# Altium schematic symbol library CUSTOM SCH - Copy.SchLib: 494 symbols (part 1 of 6) (continued)
## 15130802601000 (continued)

## 046277003001883+
designator J?
FFC & FPC Connectors 0.5 FPC 3 pin Kyocera; Manufacturer Part Number: 046277003001883+
footprint 046277003001883
pins: 1, 2, 3, S1 SHIELD, S2 SHIELD

## _FAB
designator FAB?, comment <Name>  PartNumber: 620-00XXX

## A10
designator U?, comment A20
footprint TFBGA441
pins: A1 LCD1_D15/ATAD11/KP_IN5/SMC_VPPPP/EINT15/CSI1_D15/PH15, A2 LCD1_D13/ATAD9/PS2_SDA1/SMC_RST/EINT13/CSI1_D13/PH13, A3 LCD1_D10/ATAD6/KP_IN2/MS_D2/EINT10/CSI1_D10/PH10, A4 LCD1_D6/ATAD2/UART5_TX/MS_BS/EINT6/CSI1_D6/PH6, A5 LCD1_D3/ATAIRQ/UART3_CTS/EINT3/CSI1_D3/PH3, A6 LCD1_D0/ATAA0/UART3_TX/EINT0/CSI1_D0/PH0, A7 UART0_TX/IR1_TX/PB22, A8 TWI1_SCK/PB18, A9 JTAG_DO0/SPI2_MOSI/PB16, A10 JTAG_MS0/SPI2_CS0/PB14, A11 I2S_DO0/AC97_DO/PB8, A12 I2S_BCLK/AC97_BCLK/PB6, A13 IR0_RX/PB4, A14 PWM0/PB2, A15 TWI0_SCK/PB0, A16 SDC3_D2/PI8, A17 SDC3_D0/PI6, A18 SDC3_CMD/PI4, A19 PI2, A20 PI0, A21 TS0_D7/CSI0_D7/PE11, A22 TS0_D5/CSI0_D5/PE9, A23 TS0_D4/CSI0_D4/PE8, AA1 SDQ12/SDQ8, AA2 SDQS1#/SDQS1B, AA3 SA8, AA4 SCS1, AA5 ODT0/SODT, AA6 SRST, AA7 SZQ, AA8 SVREF3, AA9 LCD0_DE/SMC_RST/PD25, AA10 LCD0_D21/SMC_VPPEN/PD21, AA11 LCD0_D19/LVDS1_VN3/PD19, AA12 LCD0_D17/LVDS1_VNC/PD17, AA13 LCD0_D15/LVDS1_VN2/PD15, AA14 LCD0_D13/LVDS1_VN1/PD13, AA15 LCD0_D11/LVDS1_VN0/PD11, AA16 VRP_TVIN/VCC-TVOUT, AA17 TVIN2/VCC25-TVIN, AA18 GND25_TVIN/VRN-TVIN, AA19 HPCOM, AA20 HPCOMFB, AA21 VMIC, AA22 XN_TP/TPX2, AA23 YN_TP/TPY2, AB1 SDQS1, AB2 SDQ8/SDQ11, AB3 SDQ13/SDQ14, AB4 SDQ0/SDQ6, AB5 SDQ5/SDQ3, AB6 SDQS0, AB7 SDQ6/SDQ4, AB8 SDQ3/SDQ5, AB9 LCD0_HSYNC/SMC_SLK/PD26, AB10 LCD0_D22/SMC_VPPPP/PD22, AB11 LCD0_D8/LVDS0_VP3/PD8, AB12 LCD0_D6/LVDS0_VPC/PD6, AB13 LCD0_D4/LVDS0_VP2/PD4, AB14 LCD0_D2/LVDS0_VP1/PD2, AB15 LCD0_D0/LVDS0_VP0/PD0, AB16 TVOUT1/VGA-B/TVIN1, AB17 TVOUT3/TVIN3, AB18 TVIN1/GND, AB19 HPVCCIN/VCCHP, AB20 LINEINL, AB21 LINEINR, AB22 LRADC1, AB23 LRADC0, AC1 SDQ15/SDQ9, AC2 SDQ10/SDQ12, AC3 SDQ7, AC4 SDQ2/SDQ1, AC5 SDQS0#/SDQS0B, AC6 SDQM0, AC7 SDQ1/SDQ0, AC8 SDQ4/SDQ2, AC9 LCD0_VSYNC/SMC_SDA/PD27, AC10 LCD0_D23/SMC_DET/PD23, AC11 LCD0_D9/LVDS0_VN3/PD9, AC12 LCD0_D7/LVDS0_VNC/PD7, AC13 LCD0_D5/LVDS0_VN2/PD5, AC14 LCD0_D3/LVDS0_VN1/PD3, AC15 LCD0_D1/LVDS0_VN0/PD1, AC16 TVOUT0/VGA-G/TVIN0, AC17 TVOUT2/VGA-R/TVIN2, AC18 TVIN0/GND, AC19 HPVCC/HPBP, AC20 MICIN1, AC21 MICIN2, AC22 MIC1OUTP, AC23 MIC1OUTN, B1 LCD1_D16/ATAD12/KP_IN6/SMC_DET/EINT16/CSI1_D16/PH16, B2 LCD1_D14/ATAD10/KP_IN4/SMC_VPPEN/EINT14/CSI1_D14/PH14, B3 LCD1_D11/ATAD7/KP_IN3/MS_D3/EINT11/CSI1_D11/PH11, B4 LCD1_D7/ATAD3/UART5_RX/MS_CLK/EINT7/CSI1_D7/PH7, B5 LCD1_D4/ATAD0/UART4_TX/EINT4/CSI1_D4/PH4, B6 LCD1_D1/ATAA1/UART3_RX/EINT1/CSI1_D1/PH1, B7 UART0_RX/IR1_RX/PB23, B8 TWI1_SDA/PB19, B9 JTAG_DI0/SPI2_MISO/PB17, B10 JTAG_CK0/SPI2_CLK/PB15, B11 SPI2_CS1/SPDIF_DO/PB13, B12 I2S_LRCK/AC97_SYNC/PB7, B13 I2S_MCLK/AC97_MCLK/PB5, B14 IR0_TX/SPDIF_MCLK/STANBYWFI/PB3, B15 TWI0_SDA/PB1, B16 SDC3_D3/PI9, B17 SDC3_D1/PI7, B18 SDC3_CLK/PI5, B19 PWM1/PI3, B20 PI1, B21 TS0_D6/CSI0_D6/PE10, B22 TS0_D3/CSI0_D3/PE7, B23 TS0_D2/CSI0_D2/PE6, C1 LCD1_D17/ATAD13/KP_IN7/SMC_VCCEN/EINT17/CSI1_D17/PH17, C2 LCD1_D18/ATAD14/KP_OUT0/SMC_SLK/EINT18/CSI1_D18/PH18, C3 LCD1_D12/ATAD8/PS2_SCK1/EINT12/CSI1_D12/PH12, C4 LCD1_D8/ATAD4/KP_IN0/MS_D0/EINT8/CSI1_D8/PH8, C5 LCD1_D5/ATAD1/UART4_RX/EINT5/CSI1_D5/PH5, C6 LCD1_D2/ATAA2/UART3_RTS/EINT2/CSI1_D2/PH2, C7 TWI2_SDA/PB21, C8 TWI2_SCK/PB20, C9 I2S_DI/AC97_DI/SPDIF_DI/PB12, C10 I2S_DO3/PB11, C11 I2S_DO2/PB10, C12 I2S_DO1/PB9, C13 ETXERR/CAN_RX/UART1_RING/PA17, C14 RESET#, C15 PS2_SCK1/TCLKIN0/EINT26/SPI0_CS1/PI14, C16 SPI0_MOSI/UART6_TX/EINT24/PI12, C17 SPI0_CS0/UART5_TX/EINT22/PI10, C18 TS1_D7/CSI1_D7/UART4_RX/CSI0_D15/PG11, C19 TS1_D5/CSI1_D5/UART3_CTS/CSI0_D13/PG9, C20 TS1_D3/CSI1_D3/UART3_RX/CSI0_D11/PG7, C21 TS1_D1/CSI1_D1/SDC1_D3/CSI0_D9/PG5, C22 TS0_D1/CSI0_D1/PE5, C23 TS0_D0/CSI0_D0/PE4, D1 LCD1_D19/ATAD15/KP_OUT1/SMC_SDA/EINT19/CSI1_D19/PH19, D2 LCD1_D20/ATAOE/CAN_TX/EINT20/CSI1_D20/PH20, D3 LCD1_D21/ATADREQ/CAN_RX/EINT21/CSI1_D21/PH21, D4 LCD1_D9/ATAD5/KP_IN1/MS_D1/EINT9/CSI1_D9/PH9, D5 ERXD3/SPI1_CS0/PA0, D6 ERXD1/SPI1_MOSI/PA2, D7 ETXD3/SPI1_CS1/PA4, D8 ETXD1/SPI3_CLK/PA6, D9 ERXCK/SPI3_MISO/PA8, D10 ERXDV/UART1_TX/PA10, D11 EMDIO/UART6_TX/UART1_RTS/PA12, D12 ETXCK/UART7_TX/UART1_DTR/PA14, D13 ECOL/CAN_TX/UART1_DCD/PA16, D14 EINT31/SPI1_MISO/UART2_RX/PI19, D15 PS2_SDA1/TCLKIN1/EINT27/SPI1_CS1/PI15, D16 SPI0_MISO/UART6_RX/EINT25/PI13, D17 SPI0_CLK/UART5_RX/EINT23/PI11, D18 TS1_D6/CSI1_D6/UART4_TX/CSI0_D14/PG10, D19 TS1_D4/CSI1_D4/UART3_RTS/CSI0_D12/PG8, D20 TS1_D0/CSI1_D0/SDC1_D2/CSI0_D8/PG4, D21 TS1_DVLD/CSI1_VSYNC/SDC1_D1/PG3, D22 TS0_DVLD/CSI0_VSYNC/PE3, D23 TS0_SYNC/CSI0_HSYNC/PE2, E1 LCD1_D22/ATADACK/KP_OUT2/SDC1_CMD/CSI1_D22/PH22, E2 LCD1_D23/ATACS0/KP_OUT3/SDC1_CLK/CSI1_D23/PH23, E3 LCD1_CLK/ATACS1/KP_OUT4/SDC1_D0/CSI1_PCLK/PH24, E4 LCD1_DE/ATAIORDY/KP_OUT5/SDC1_D1/CSI1_FIELD/PH25, E5 ERXD2/SPI1_CLK/PA1, E6 ERXD0/SPI1_MISO/PA3, E7 ETXD2/SPI3_CS0/PA5, E8 ETXD0/SPI3_MOSI/PA7, E9 ERXERR/SPI3_CS1/PA9, E10 EMDC/UART1_RX/PA11, E11 ETXEN/UART6_RX/UART1_CTS/PA13, E12 ECRS/UART7_RX/UART1_DSR/PA15, E13 HSDA/UART7_RX/PS2_SDA0/PI21, E14 HSCL/UART7_TX/PS2_SCK0/PI20, E15 EINT30/SPI1_MOSI/UART2_TX/PI18, E16 EINT29/SPI1_CLK/UART2_CTS/PI17, E17 EINT28/SPI1_CS0/UART2_RTS/PI16, E18 VCC_CSI1/VCC-PG, E19 TS1_D2/CSI1_D2/UART3_TX/CSI0_D10/PG6, E20 TS1_SYNC/CSI1_HSYNC/SDC1_D0/PG2, E21 TS1_ERR/CSI1_MLCK/SDC1_CLK/PG1, E22 TS0_ERR/CSI0_MCLK/PE1, E23 TS0_CLK/CSI0_PCLK/PE0, F1 CLK32K_IN, F2 CLK32K_OUT, F3 LCD1_HSYNC/ATAIOR/KP_OUT6/SDC1_D2/CSI1_HSYNC/PH26, F4 LCD1_VSYNC/ATAIOW/KP_OUT7/SDC1_D3/CSI1_VSYNC/PH27, F5 NMI#, F19 VCC_CSI0/VCC-PE, F20 TS1_CLK/CSI1_PCLK/SDC1_CMD/PG0, F21 NDQS/PC24, F22 NCE3/PC18, F23 NCE2/PC17, G1 SDQM3, G2 SDQ30/SDQ29, G3 GND/GND_DRAM, G4 GND/GND_DRAM, G5 VCC_DRAM, G19 SPI0_CS0/PC23, G20 NDQ7/PC15, G21 NDQ6/PC14, G22 NDQ3/SDC2_D3/PC11, G23 NDQ2/SDC2_D2/PC10, H1 SDQ25/SDQ26, H2 SDQ27/SDQ31, H3 SVREF0, H4 SVREF1, H5 VCC_DRAM, H8 VCC, H9 VCC, H10 VCC-PA/VCC, H11 VDD_CPU, H12 VDD_CPU, H13 VDD_CPU, H14 VDD_CPU, H15 VCC, H16 TEST, H19 VCC-PC/VCC_NAND, H20 NDQ5/PC13, H21 NDQ4/PC12, H22 NDQ1/SDC2_D1/PC9, H23 NDQ0/SDC2_D0/PC8, J1 SDQ28/SDQ24, J2 SDQS3#/SDQS3B, J3 ODT1/SCK1B, J4 SCKE1, J5 GND/GND_DRAM, J8 VCC, J9 VCC, J10 VCC-PA/VCC, J11 GND, J12 VDD_CPU, J13 VDD_CPU, J14 VCC, J15 VDD-SYS/VDD_INT, J16 VDD-SYS/VDD_INT, J19 VCC-PC/VCC_NAND, J20 NCE7/SPI2_MISO/PC22, J21 NCE6/SPI2_MOSI/PC21, J22 NRB1/SDC2_CLK/PC7, J23 NRB0/SDC2_CMD/PC6, K1 SDQS3/SDQS3, K2 SDQ31/SDQ27, K3 SBA0, K4 SBA2, K5 GND/GND_DRAM, K8 RTC_VDD, K9 VDD-SYS/VDD_INT, K10 VDD-SYS/VDD_INT, K11 GND, K12 GND, K13 GND, K14 ULGND/GND, K15 VDD-SYS/VDD_INT, K16 ULVDD/VDD-USB, K19 SDC0_D2/JTAG_CK1/PF5, K20 SDC0_D3/UART0_RX/PF4, K21 NCE5/SPI2_CLK/PC20, K22 NRE#/PC5, K23 NCE0/PC4, L1 SDQ24/SDQ25, L2 SDQ26/SDQ28, L3 SA10, L4 SBA1, L5 VCC_DRAM, L8 VDD-SYS/VDD_INT, L9 VDD-SYS/VDD_INT, L10 GND, L11 GND, L12 GND, L13 UGND_T/GND, L14 UGND_C/GND, L15 UVCC_T/VCC-USB, L16 UVCC_C/VCC-USB, L19 SDC0_CMD/JTAG_DO1/PF3, L20 SDC0_CLK/UART0_TX/PF2, L21 NCE4/SPI2_CS0/PC19, L22 NCE1/PC3, L23 NCLE/SPI0_CLK/PC2, M1 SDQ29/SQD30, M2 SDQ23, M3 SA7, M4 SA3, M5 VCC_DRAM, M8 VDD_DLL, M9 GND/GND_DLL, M10 GND, M11 GND, M12 GND, M13 GND, M14 GND/GND_SATA, M15 VDD12_SATA, M16 VDD12_SATA, M19 SDC0_D0/JTAG_DI1/PF1, M20 SDC0_D1/JTAG_MS1/PF0, M21 NWP/PC16, M22 NALE/SPI0_MISO/PC1, M23 NWE#/SPI0_MOSI/PC0, N1 SDQ16/SDQ22, N2 SDQ18/SDQ17, N3 SCKE0, N4 SA5, N5 GND/GND_DRAM, N8 ADBG/SADBG, N9 VDD_DLL, N10 GND/GND_DLL, N11 GND, N12 GND, N13 GND/GND_SATA, N14 GND/GND_SATA, N15 VDD25_SATA, N16 VDD25_SATA, N19 VCC_CARD/VCC-PF, N20 DM0, N21 DP0, N22 CLK24M_OUT, N23 CLK24M_IN, P1 SDQ21/SDQ19, P2 SDQS2#/SDQS2B, P3 SA12, P4 SA9, P5 GND/GND_DRAM, P8 SDBG0/SDDBG0, P9 VDD_DLL, P10 GND/GND_DLL, P11 GND, P12 GND, P13 GND/GND_HDMI, P14 GND/GND_HDMI, P15 PLLGND/GND, P16 PLLVP25/VCC-PLL, P19 CLKM_SATA, P20 DM1, P21 DP1, P22 HPD_HDMI/HHPD, P23 CEC_HDMI/HCEC, R1 SDQS2, R2 SDQM2, R3 SA14, R4 SA1, R5 VCC_DRAM, R8 SDBG1/SADBG1, R9 VDD-SYS/VDD_INT, R10 VDD-SYS/VDD_INT, R11 GND, R12 GND, R13 GND/GND_HDMI, R14 VREGIO2_HDMI/NC, R15 PLLVREG, R16 PLLREGIO/NC, R19 CLKP_SATA, R20 DM2, R21 DP2, R22 SDA_HDMI/HSDA, R23 SCL_HDMI/HSCL, T1 SDQ22/SDQ20, T2 SDQ17/SDQ16, T3 SWE, T4 SRAS, T5 VCC_DRAM, T8 VDD-SYS/VDD_INT, T9 EFUSE_VDDQ/VDDQE, T10 JTAG_SEL, T11 GND, T12 GND, T13 VP_HDMI/VCC-HDMI, T14 VREGIO1_HDMI/HVREG1, T15 PLLTEST, T16 PLLDV, T19 AVCC, T20 TXP_SATA, T21 TXM_SATA, T22 TX2N_HDMI/HTX2N, T23 TX2P_HDMI/HTX2P, U1 SDQ19/SDQ21, U2 SDQ20/SDQ18, U3 SCAS, U4 SA2, U5 GND/GND_DRAM, U19 AGND, U20 RXM_SATA, U21 RXP_SATA, U22 TX1N_HDMI/HTX1N, U23 TX1P_HDMI/HTX1P, V1 SCK, V2 SCK#/SCKB, V3 SCS0/SCS, V4 SA6, V5 GND/GND_DRAM, V19 HPGND, V20 VRA2, V21 REXT_SATA, V22 TX0N_HDMI/HTX0N, V23 TX0P_HDMI/HTX0P, W1 SDQM1, W2 SDQ14/SDQ13, W3 SA11, W4 SA0, W5 VCC_DRAM, W6 VCC_DRAM, W7 VCC_DRAM, W8 UBOOT_SEL, W9 GND/GND_LVDS, W10 GND/GND_LVDS, W11 GND/GND_LVDS, W12 VCC_LVDS, W13 VCC_LVDS, W14 VCC_LVDS, W15 VCC33_TVOUT/TVOUT0, W16 VCC33_TVIN/TVOUT2, W17 VDD25_TVIN/VRP-TVIN, W18 GND33_TVOUT/TVOUT1, W19 HPOUTR/HPR, W20 VRA1, W21 VRP, W22 TXCN_HDMI/HTXCN, W23 TXCP_HDMI/HTXCP, Y1 SDQ9/SDQ10, Y2 SDQ11/SDQ15, Y3 SA13, Y4 SA4, Y5 SVREF2, Y6 VCC_DRAM, Y7 GND/GND_DRAM, Y8 GND/GND_DRAM, Y9 LCD0_CLK/SMC_VCCEN/PD24, Y10 LCD0_D20/CSI1_MCLK/PD20, Y11 LCD0_D18/LVDS1_VP3/PD18, Y12 LCD0_D16/LVDS1_VPC/PD16, Y13 LCD0_D14/LVDS1_VP2/PD14, Y14 LCD0_D12/LVDS1_VP1/PD12, Y15 LCD0_D10/LVDS1_VP0/PD10, Y16 VRN_TVIN/VCC-TVIN, Y17 TVIN3/GND, Y18 GND33_TVIN/TVOUT3, Y19 HPOUTL/HPL, Y20 FMINL, Y21 FMINR, Y22 XP_TP/TPX1, Y23 YP_TP/TPY1
text: ERXD3/; ERXD2/; ERXD1/; ERXD0/; ETXD3/; ETXD2/; ETXD1/; ETXD0/; ERXCK/; ERXERR/; ERXDV/; EMDC/; EMDIO/; /TWI3_SCK; ETEN/; /TWI3_SDA; ETXCK/; /TWI4_SCK; ECRS/; ECOL/; ETXERR/; /OWA-MCLK; /CLK_OUT_A; /CLK_OUT_B

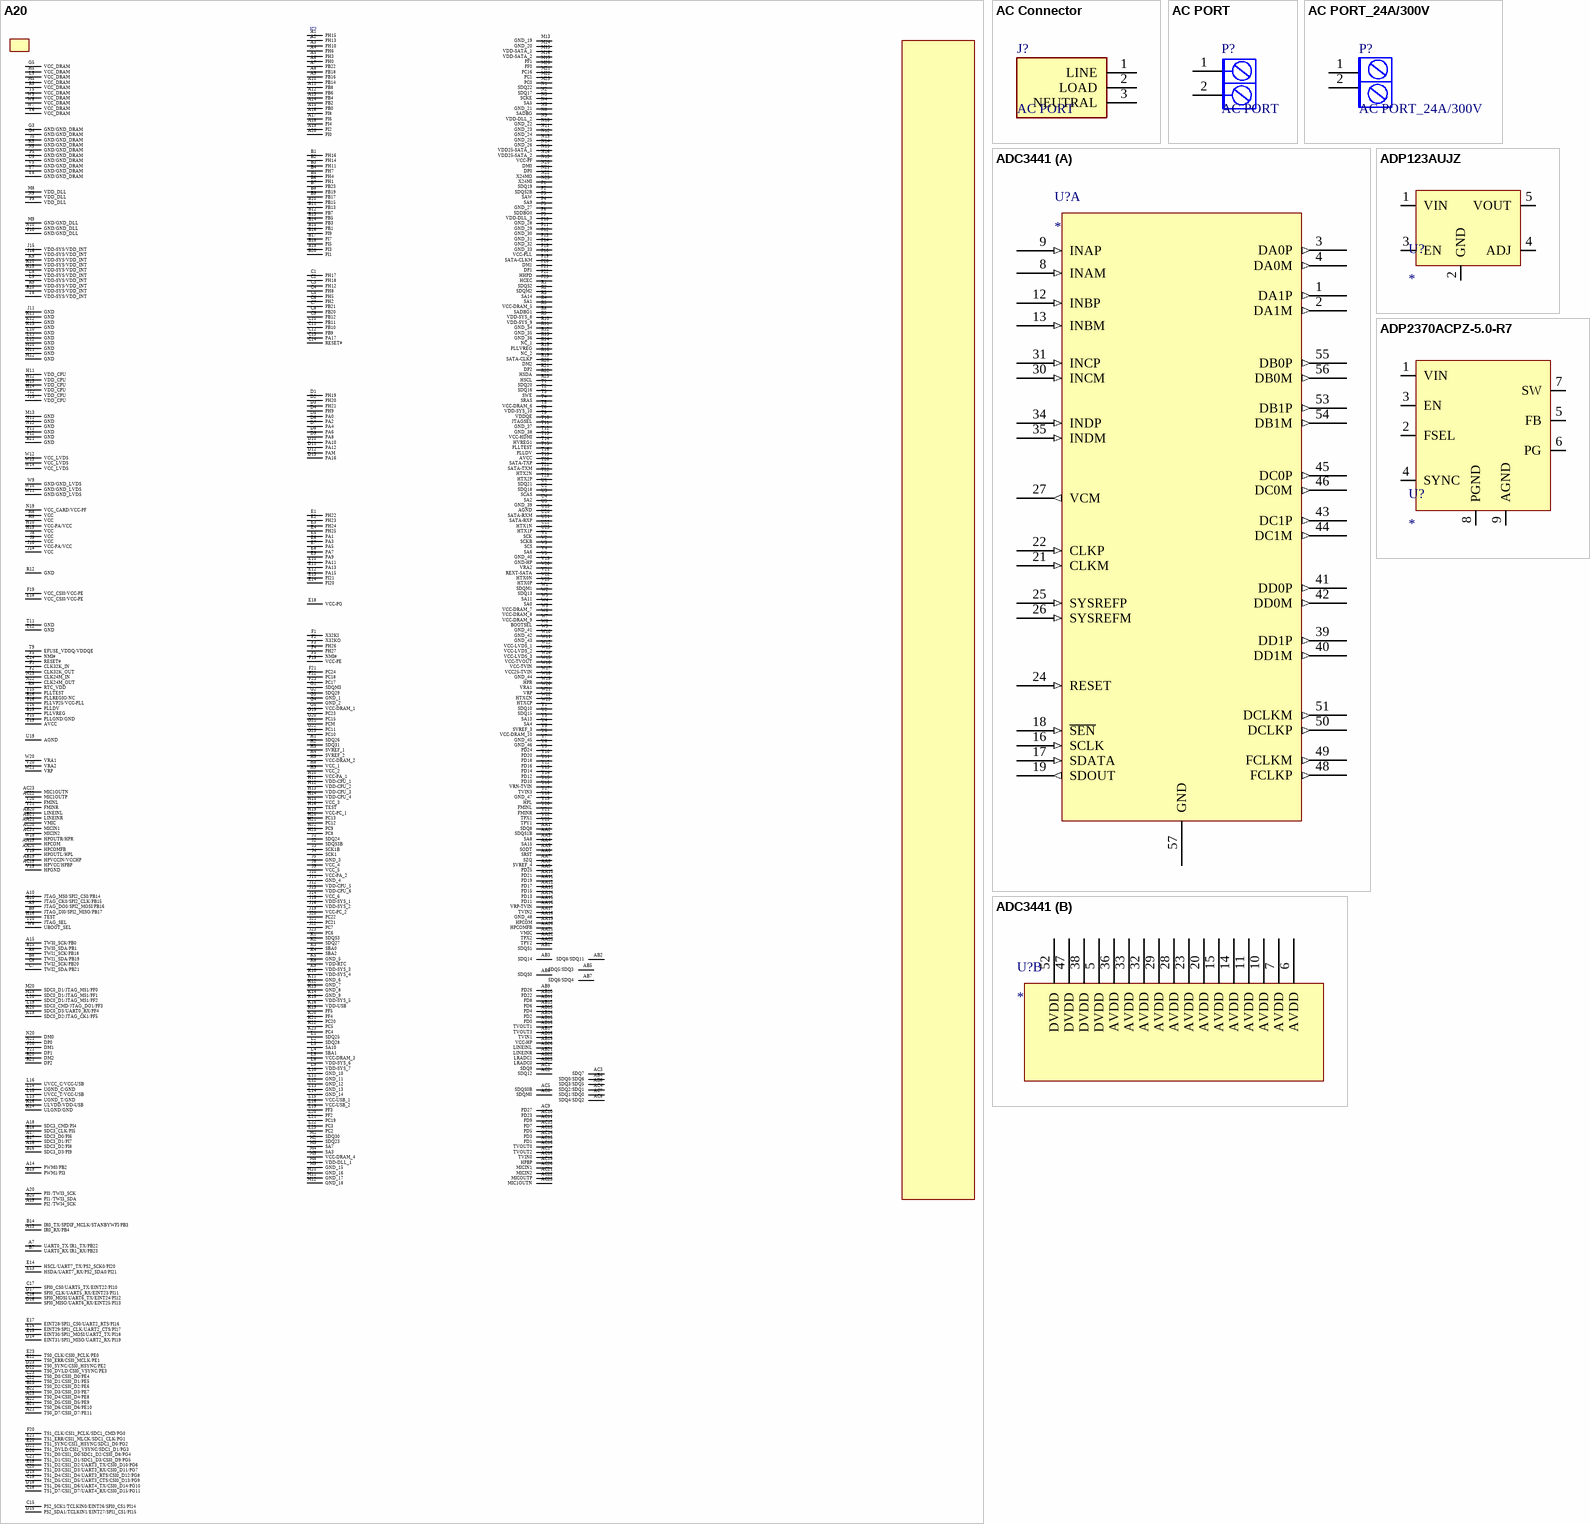
[diagram p2: symbols A20 to ADP2370ACPZ-5.0-R7]

## A20
designator IC?
Integrated Circuit; Manufacturer_Name: Allwinner Technology; Manufacturer_Part_Number: A20; Datasheet Link: http://dl.linux-sunxi.org/A20/A20%20Brief%202013-02-27.pdf; Height: 1.4mm; Arrow Part Number: A20
footprint FBGA441
pins: A1 PH15, A2 PH13, A3 PH10, A4 PH6, A5 PH3, A6 PH0, A7 PB22, A7 UART0_TX/IR1_TX/PB22, A8 PB18, A8 TWI1_SCK/PB18, A9 PB16, A9 JTAG_DO0/SPI2_MOSI/PB16, A10 PB14, A10 JTAG_MS0/SPI2_CS0/PB14, A11 PB8, A12 PB6, A13 PB4, A13 IR0_RX/PB4, A14 PB2, A14 PWM0/PB2, A15 PB0, A15 TWI0_SCK/PB0, A16 PI8, A16 SDC3_D2/PI8, A17 PI6, A17 SDC3_D0/PI6, A18 PI4, A18 SDC3_CMD/PI4, A19 PI2, A19 PI2 /TWI4_SCK, A20 PI0, A20 PI0 /TWI3_SCK, A21 TS0_D7/CSI0_D7/PE11, A22 TS0_D5/CSI0_D5/PE9, A23 TS0_D4/CSI0_D4/PE8, AA1 SDQ8, AA2 SDQS1B, AA3 SA8, AA4 SA15, AA5 SODT, AA6 SRST, AA7 SZQ, AA8 SVREF_4, AA9 PD25, AA10 PD21, AA11 PD19, AA12 PD17, AA13 PD15, AA14 PD13, AA15 PD11, AA16 VRP-TVIN, AA17 TVIN2, AA18 GND_48, AA19 HPCOM, AA19 HPCOM, AA20 HPCOMFB, AA20 HPCOMFB, AA21 VMIC, AA21 VMIC, AA22 TPX2, AA23 TPY2, AB1 SDQS1, AB2 SDQ8/SDQ11, AB3 SDQ14, AB4 SDQ0/SDQ6, AB5 SDQ5/SDQ3, AB6 SDQS0, AB7 SDQ6/SDQ4, AB8 SDQ3/SDQ5, AB9 PD26, AB10 PD22, AB11 PD8, AB12 PD6, AB13 PD4, AB14 PD2, AB15 PD0, AB16 TVOUT1, AB17 TVOUT3, AB18 TVIN1, AB19 VCC-HP, AB19 HPVCCIN/VCCHP, AB20 LINEINL, AB20 LINEINL, AB21 LINEINR, AB21 LINEINR, AB22 LRADC1, AB23 LRADC0, AC1 SDQ9, AC2 SDQ12, AC3 SDQ7, AC4 SDQ2/SDQ1, AC5 SDQS0B, AC6 SDQM0, AC7 SDQ1/SDQ0, AC8 SDQ4/SDQ2, AC9 PD27, AC10 PD23, AC11 PD9, AC12 PD7, AC13 PD5, AC14 PD3, AC15 PD1, AC16 TVOUT0, AC17 TVOUT2, AC18 TVIN0, AC19 HPBP, AC19 HPVCC/HPBP, AC20 MICIN1, AC20 MICIN1, AC21 MICIN2, AC21 MICIN2, AC22 MICOUTP, AC22 MIC1OUTP, AC23 MIC1OUTN, AC23 MIC1OUTN, B1 PH16, B2 PH14, B3 PH11, B4 PH7, B5 PH4, B6 PH1, B7 PB23, B7 UART0_RX/IR1_RX/PB23, B8 PB19, B8 TWI1_SDA/PB19, B9 PB17, B9 JTAG_DI0/SPI2_MISO/PB17, B10 PB15, B10 JTAG_CK0/SPI2_CLK/PB15, B11 PB13, B12 PB7, B13 PB5, B14 PB3, B14 IR0_TX/SPDIF_MCLK/STANBYWFI/PB3, B15 PB1, B15 TWI0_SDA/PB1, B16 PI9, B16 SDC3_D3/PI9, B17 PI7, B17 SDC3_D1/PI7, B18 PI5, B18 SDC3_CLK/PI5, B19 PI3, B19 PWM1/PI3, B20 PI1, B20 PI1 /TWI3_SDA, B21 TS0_D6/CSI0_D6/PE10, B22 TS0_D3/CSI0_D3/PE7, B23 TS0_D2/CSI0_D2/PE6, C1 PH17, C2 PH18, C3 PH12, C4 PH8, C5 PH5, C6 PH2, C7 PB21, C7 TWI2_SDA/PB21, C8 PB20, C8 TWI2_SCK/PB20, C9 PB12, C10 PB11, C11 PB10, C12 PB9, C13 PA17, C14 RESET#, C14 RESET#, C15 PS2_SCK1/TCLKIN0/EINT26/SPI0_CS1/PI14, C16 SPI0_MOSI/UART6_TX/EINT24/PI12, C17 SPI0_CS0/UART5_TX/EINT22/PI10, C18 TS1_D7/CSI1_D7/UART4_RX/CSI0_D15/PG11, C19 TS1_D5/CSI1_D5/UART3_CTS/CSI0_D13/PG9, C20 TS1_D3/CSI1_D3/UART3_RX/CSI0_D11/PG7, C21 TS1_D1/CSI1_D1/SDC1_D3/CSI0_D9/PG5, C22 TS0_D1/CSI0_D1/PE5, C23 TS0_D0/CSI0_D0/PE4, D1 PH19, D2 PH20, D3 PH21, D4 PH9, D5 PA0, D6 PA2, D7 PA4, D8 PA6, D9 PA8, D10 PA10, D11 PA12, D12 PAM, D13 PA16, D14 EINT31/SPI1_MISO/UART2_RX/PI19, D15 PS2_SDA1/TCLKIN1/EINT27/SPI1_CS1/PI15, D16 SPI0_MISO/UART6_RX/EINT25/PI13, D17 SPI0_CLK/UART5_RX/EINT23/PI11, D18 TS1_D6/CSI1_D6/UART4_TX/CSI0_D14/PG10, D19 TS1_D4/CSI1_D4/UART3_RTS/CSI0_D12/PG8, D20 TS1_D0/CSI1_D0/SDC1_D2/CSI0_D8/PG4, D21 TS1_DVLD/CSI1_VSYNC/SDC1_D1/PG3, D22 TS0_DVLD/CSI0_VSYNC/PE3, D23 TS0_SYNC/CSI0_HSYNC/PE2, E1 PH22, E2 PH23, E3 PH24, E4 PH25, E5 PA1, E6 PA3, E7 PA5, E8 PA7, E9 PA9, E10 PA11, E11 PA13, E12 PA15, E13 PI21, E13 HSDA/UART7_RX/PS2_SDA0/PI21, E14 PI20, E14 HSCL/UART7_TX/PS2_SCK0/PI20, E15 EINT30/SPI1_MOSI/UART2_TX/PI18, E16 EINT29/SPI1_CLK/UART2_CTS/PI17, E17 EINT28/SPI1_CS0/UART2_RTS/PI16, E18 VCC-PG, E18 VCC_CSI0/VCC-PE, E19 TS1_D2/CSI1_D2/UART3_TX/CSI0_D10/PG6, E20 TS1_SYNC/CSI1_HSYNC/SDC1_D0/PG2, E21 TS1_ERR/CSI1_MLCK/SDC1_CLK/PG1, E22 TS0_ERR/CSI0_MCLK/PE1, E23 TS0_CLK/CSI0_PCLK/PE0, F1 X32KI, F1 CLK32K_IN, F2 X32KO, F2 CLK32K_OUT, F3 PH26, F4 PH27, F5 NMI#, F5 NMI#, F19 VCC-PE, F19 VCC_CSI0/VCC-PE, F20 TS1_CLK/CSI1_PCLK/SDC1_CMD/PG0, F21 PC24, F22 PC18, F23 PC17, G1 SDQM3, G2 SDQ29, G3 GND_1, G3 GND/GND_DRAM, G4 GND_2, G4 GND/GND_DRAM, G5 VCC-DRAM_1, G5 VCC_DRAM, G19 PC23, G20 PC15, G21 PCM, G22 PC11, G23 PC10, H1 SDQ26, H2 SDQ31, H3 SVREF_1, H4 SVREF_2, H5 VCC-DRAM_2, H5 VCC_DRAM, H8 VCC_1, H8 VCC, H9 VCC_2, H9 VCC, H10 VCC-PA_1, H10 VCC-PA/VCC, H11 VDD-CPU_1, H11 VDD_CPU, H12 VDD-CPU_2, H12 VDD_CPU, H13 VDD-CPU_3, H13 VDD_CPU, H14 VDD-CPU_4, H14 VDD_CPU, H15 VCC_3, H15 VCC, H16 TEST, H16 TEST, H19 VCC-PC_1, H20 PC13, H21 PC12, H22 PC9, H23 PC8, J1 SDQ24, J2 SDQS3B, J3 SCK1B, J4 SCK1, J5 GND_3, J5 GND/GND_DRAM, J8 VCC_4, J8 VCC, J9 VCC_5, J9 VCC, J10 VCC-PA_2, J10 VCC-PA/VCC, J11 GND_4, J11 GND, J12 VDD-CPU_5, J12 VDD_CPU, J13 VDD-CPU_6, J13 VDD_CPU, J14 VCC_6, J14 VCC, J15 VDD-SYS_1, J15 VDD-SYS/VDD_INT, J16 VDD-SYS_2, J16 VDD-SYS/VDD_INT, J19 VCC-PC_2, J20 PC22, J21 PC21, J22 PC7, J23 PC6, K1 SDQS3, K2 SDQ27, K3 SBA0, K4 SBA2, K5 GND_5, K5 GND/GND_DRAM, K8 VDD-RTC, K8 RTC_VDD, K9 VDD-SYS_3, K9 VDD-SYS/VDD_INT, K10 VDD-SYS_4, K10 VDD-SYS/VDD_INT, K11 GND_6, K11 GND, K12 GND_7, K12 GND, K13 GND_8, K13 GND, K14 GND_9, K14 ULGND/GND, K15 VDD-SYS_5, K15 VDD-SYS/VDD_INT, K16 VDD-USB, K16 ULVDD/VDD-USB, K19 PF5, K19 SDC0_D2/JTAG_CK1/PF5, K20 PF4, K20 SDC0_D3/UART0_RX/PF4, K21 PC20, K22 PC5, K23 PC4, L1 SDQ25, L2 SDQ28, L3 SA10, L4 SBA1, L5 VCC-DRAM_3, L5 VCC_DRAM, L8 VDD-SYS_6, L8 VDD-SYS/VDD_INT, L9 VDD-SYS_7, L9 VDD-SYS/VDD_INT, L10 GND_10, L10 GND, L11 GND_11, L11 GND, L12 GND_12, L12 GND, L13 GND_13, L13 UGND_T/GND, L14 GND_14, L14 UGND_C/GND, L15 VCC-USB_1, L15 UVCC_T/VCC-USB, L16 VCC-USB_2, L16 UVCC_C/VCC-USB, L19 PF3, L19 SDC0_CMD/JTAG_DO1/PF3, L20 PF2, L20 SDC0_D1/JTAG_MS1/PF2, L21 PC19, L22 PC3, L23 PC2, M1 SDQ30, M2 SDQ23, M3 SA7, M4 SA3, M5 VCC-DRAM_4, M5 VCC_DRAM, M8 VDD-DLL_1, M8 VDD_DLL, M9 GND_15, M9 GND/GND_DLL, M10 GND_16, M10 GND, M11 GND_17, M11 GND, M12 GND_18, M12 GND, M13 GND_19, M13 GND, M14 GND_20, M15 VDD-SATA_1, M16 VDD-SATA_2, M19 PF1, M19 SDC0_D1/JTAG_MS1/PF1, M20 PF0, M20 SDC0_D1/JTAG_MS1/PF0, M21 PC16, M22 PC1, M23 PC0, N1 SDQ22, N2 SDQ17, N3 SCKE, N4 SA5, N5 GND_21, N5 GND/GND_DRAM, N8 SADBG, N9 VDD-DLL_2, N9 VDD_DLL, N10 GND_22, N10 GND/GND_DLL, N11 GND_23, N11 GND, N12 GND_24, N12 GND, N13 GND_25, N14 GND_26, N15 VDD25-SATA_1, N16 VDD25-SATA_2, N19 VCC-PF, N19 VCC_CARD/VCC-PF, N20 DM0, N20 DM0, N21 DP0, N21 DP0, N22 X24MO, N22 CLK24M_OUT, N23 X24MI, N23 CLK24M_IN, P1 SDQ19, P2 SDQS2B, P3 SAW, P4 SA9, P5 GND_27, P5 GND/GND_DRAM, P8 SDDBG0, P9 VDD-DLL_3, P9 VDD_DLL, P10 GND_28, P10 GND/GND_DLL, P11 GND_29, P11 GND, P12 GND_30, P12 GND, P13 GND_31, P14 GND_32, P15 GND_33, P15 PLLGND/GND, P16 VCC-PLL, P16 PLLVP25/VCC-PLL, P19 SATA-CLKM, P20 DM1, P20 DM1, P21 DP1, P21 DP1, P22 HHPD, P23 HCEC, R1 SDQS2, R2 SDQM2, R3 SA14, R4 SA1, R5 VCC-DRAM_5, R5 VCC_DRAM, R8 SADBG1, R9 VDD-SYS_8, R9 VDD-SYS/VDD_INT, R10 VDD-SYS_9, R10 VDD-SYS/VDD_INT, R11 GND_34, R11 GND, R12 GND_35, R12 GND, R13 GND_36, R14 NC_1, R15 PLLVREG, R15 PLLVREG, R16 NC_2, R16 PLLREGIO/NC, R19 SATA-CLKP, R20 DM2, R20 DM2, R21 DP2, R21 DP2, R22 HSDA, R23 HSCL, T1 SDQ20, T2 SDQ16, T3 SWE, T4 SRAS, T5 VCC-DRAM_6, T5 VCC_DRAM, T8 VDD-SYS_10, T8 VDD-SYS/VDD_INT, T9 VDDQE, T9 EFUSE_VDDQ/VDDQE, T10 JTAGSEL, T10 JTAG_SEL, T11 GND_37, T11 GND, T12 GND_38, T12 GND, T13 VCC-HDMI, T14 HVREG1, T15 PLLTEST, T15 PLLTEST, T16 PLLDV, T16 PLLDV, T19 AVCC, T19 AVCC, T20 SATA-TXP, T21 SATA-TXM, T22 HTX2N, T23 HTX2P, U1 SDQ21, U2 SDQ18, U3 SCAS, U4 SA2, U5 GND_39, U5 GND/GND_DRAM, U19 AGND, U19 AGND, U20 SATA-RXM, U21 SATA-RXP, U22 HTX1N, U23 HTX1P, V1 SCK, V2 SCKB, V3 SCS, V4 SA6, V5 GND_40, V5 GND/GND_DRAM, V19 GND-HP, V19 HPGND, V20 VRA2, V20 VRA2, V21 REXT-SATA, V22 HTX0N, V23 HTX0P, W1 SDQM1, W2 SDQ13, W3 SA11, W4 SA0, W5 VCC-DRAM_7, W5 VCC_DRAM, W6 VCC-DRAM_8, W6 VCC_DRAM, W7 VCC-DRAM_9, W7 VCC_DRAM, W8 BOOTSEL, W8 UBOOT_SEL, W9 GND_41, W9 GND/GND_LVDS, W10 GND_42, W10 GND/GND_LVDS, W11 GND_43, W11 GND/GND_LVDS, W12 VCC-LVDS_1, W12 VCC_LVDS, W13 VCC-LVDS_2, W13 VCC_LVDS, W14 VCC-LVDS_3, W14 VCC_LVDS, W15 VCC-TVOUT, W16 VCC-TVIN, W17 VCC25-TVIN, W18 GND_44, W19 HPR, W19 HPOUTR/HPR, W20 VRA1, W20 VRA1, W21 VRP, W21 VRP, W22 HTXCN, W23 HTXCP, Y1 SDQ10, Y2 SDQ15, Y3 SA13, Y4 SA4, Y5 SVREF_3, Y6 VCC-DRAM_10, Y6 VCC_DRAM, Y7 GND_45, Y7 GND/GND_DRAM, Y8 GND_46, Y8 GND/GND_DRAM, Y9 PD24, Y10 PD20, Y11 PD18, Y12 PD16, Y13 PD14, Y14 PD12, Y15 PD10, Y16 VRN-TVIN, Y17 TVIN3, Y18 GND_47, Y19 HPL, Y19 HPOUTL/HPL, Y20 FMINL, Y20 FMINL, Y21 FMINR, Y21 FMINR, Y22 TPX1, Y23 TPY1

## AC Connector
designator J?, comment AC PORT
Header, 3-Pin; Manufacturer Part Number: Sunrom 4886; Case/Package: TH 7.62 Pitch
footprint HDR1X2 (Connector; Header; 2 Position)
signal-integrity model Connector
pins: 1 LINE, 2 LOAD, 3 NEUTRAL

## AC PORT
designator P?
Header, 2-Pin; Manufacturer Part Number: Screw Terminal; Value: 2 PIN; Case/Package: 5mm PITCH TH
footprint HDR1X2 (Connector; Header; 2 Position)
signal-integrity model Connector
pins: 1 L, 2 N

## AC PORT_24A/300V
designator P?
Header, 2-Pin; LatestRevisionDate: 17-Jul-2002; LatestRevisionNote: Re-released for DXP Platform.; Publisher: Altium Limited
footprint AC PORT 24a/300V (Connector; Header; 2 Position)
pins: 1, 2
